# Altium integrated library TI Power Management Battery Management.IntLib: 950 symbols (part 9 of 48) (continued)
## BQ2012SN-D107TR (continued)

## BQ2012SND107TRG4
designator U?
NiCd / NiMH Gas Gauge with 1-Wire (DQ) Interface, 5 LED Drivers and Slow-Charge Control , 0 to 70 degC, 16-pin SOIC (D), Green (RoHS & no Sb/Br); PartNumber: BQ2012SND107TRG4; Manufacturer: Texas Instruments; Lead Acid: N; NiCd: Y; SubFamily: Battery Fuel Gauge; DatasheetVersion: Rev.A; PackageVersion: revM, Jun-2011; PackageReference: D16; PackageDescription: 16-Pin Plastic Small Outline Integrated Circuit, 9.9 x 3.9 mm, Pitch 1.27 mm Pitch; Supplier 1: Digi-Key; Supplier Part Number 1: BQ2012SND107TRG4-ND; Supplier Part Number 3: 595-BQ2012SND107TRG4; Eco-Plan: Green (RoHS & no Sb/Br); Li-Ion: N; Li-Polymer: N; NiMH: Y; Over Voltage Protection: N; Mounting Technology: Surface Mount; Code_JEDEC: MS-012AC; ComponentLink1Description: Datasheet; ComponentLink1URL: http://www.ti.com/general/docs/lit/getliterature.tsp?genericPartNumber=BQ2012&fileType=pdf
footprint D16_N (SOIC, 16-Leads, Body 9.9x3.9mm, Pitch 1.27mm, IPC Medium Density)
footprint D16_L (SOIC, 16-Leads, Body 9.9x3.9mm, Pitch 1.27mm, IPC High Density)
footprint D16_M (SOIC, 16-Leads, Body 9.9x3.9mm, Pitch 1.27mm, IPC Low Density)
pins: 1 LCOM (hiz) "Open-drain output switches VCC to source current for the LEDs. The switch is off during initialization to allow reading of the soft pull-up or pull-down program resistors. LCOM is also high impedance when the display is off.", 2 SEG1/PROG1 (io) "Each output may activate an LED to sink the current sourced from LCOM. / This three-level input pin defines the programmed full count (PFC) thresholds described in Table 2.", 3 SEG2/PROG2 (io) "Each output may activate an LED to sink the current sourced from LCOM. / This three-level input pin defines the programmed full count (PFC) thresholds described in Table 2.", 4 SEG3/PROG3 (io) "Each output may activate an LED to sink the current sourced from LCOM. / This three-level input pin defines the scale factor described in Table 2.", 5 SEG4/PROG4 (io) "Each output may activate an LED to sink the current sourced from LCOM. / This three-level input pin defines the scale factor described in Table 2.", 6 SEG5/PROG5 (io) "Each output may activate an LED to sink the current sourced from LCOM. / This three-level input pin defines the selfdischarge compensation rate shown in Table 1.", 7 SEG6/PROG6 (io) "Each output may activate an LED to sink the current sourced from LCOM. / This three-level pin defines the display operation shown in Table 1.", 8 VSS (power) "Ground", 9 SR (in) "The voltage drop (VSR) across the sense resistor RS is monitored and integrated over time to interpret charge and discharge activity. The SR input is tied to the high side of the sense resistor. VSR < VSS indicates (See Datasheet)", 10 ~{DISP} "D\I\S\P\ high disables the LED display. D\I\S\P\ tied to VCC allows PROGX to connect directly to VCC or VSS instead of through a pull-up or pull-down resistor. D\I\S\P\ floating allows the LED display to be active during (See Datasheet)", 11 SB (in) "This input monitors the single-cell voltage potential through a high-impedance resistive divider network for end-of-discharge voltage (EDV) thresholds, maximum charge voltage (MCV), and battery removed.", 12 EMPTY (hiz) "This open-drain output becomes high-impedance on detection of a valid end-of-discharge voltage (VEDVF) and is low following the next application of a valid charge.", 13 DQ (io) "This is an open-drain bidirectional pin.", 14 ~{CHG} (hiz) "This open-drain output becomes active low when charging is allowed. Valid charging conditions are described in the Charge Control section.", 15 REF (out) "REF provides a voltage reference output for an optional micro-regulator.", 16 VCC (power) "Supply voltage input."

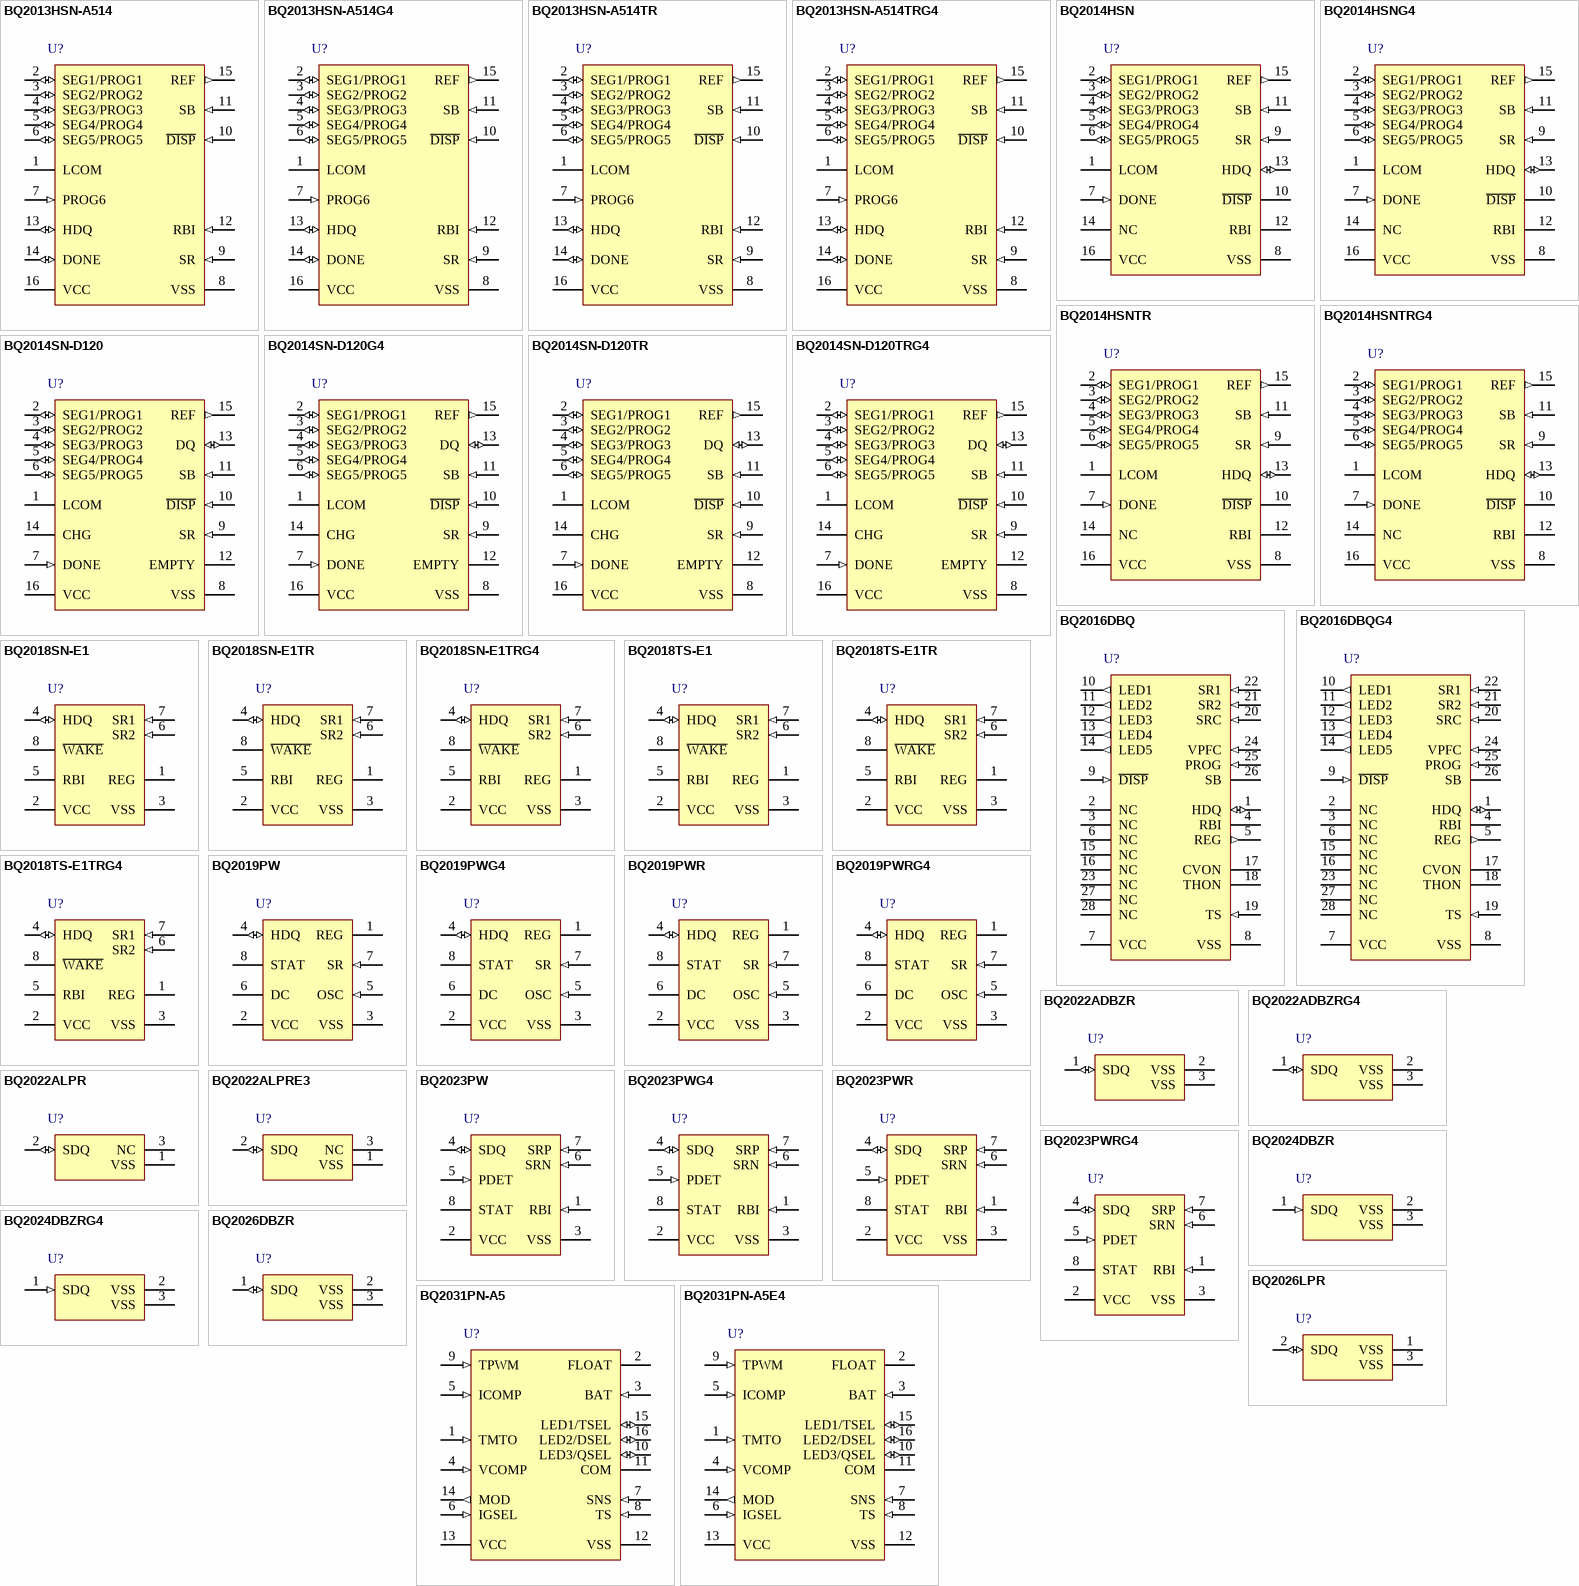
[diagram p6: symbols BQ2013HSN-A514 to BQ2031PN-A5E4]

## BQ2013HSN-A514
designator U?
NiCd / NiMH / Lead-Acid Gas Gauge for High Discharge Rates (>10 A), Pgmable Offset Error & Load Comp, 0 to 70 degC, 16-pin SOIC (D), Green (RoHS & no Sb/Br); PartNumber: BQ2013HSN-A514; Manufacturer: Texas Instruments; Lead Acid: Y; Li-Ion: N; SubFamily: Battery Fuel Gauge; DatasheetVersion: SLUS120; PackageVersion: revM, Jun-2011; PackageReference: D16; PackageDescription: 16-Pin Plastic Small Outline Integrated Circuit, 9.9 x 3.9 mm, Pitch 1.27 mm Pitch; Supplier 1: Digi-Key; Supplier Part Number 1: 296-9343-5-ND; Supplier Part Number 3: 595-BQ2013HSN-A514; Eco-Plan: Green (RoHS & no Sb/Br); Li-Polymer: N; NiCd: Y; NiMH: Y; Over Voltage Protection: N; Mounting Technology: Surface Mount; Code_JEDEC: MS-012AC; ComponentLink1Description: Datasheet; ComponentLink1URL: http://www.ti.com/general/docs/lit/getliterature.tsp?genericPartNumber=BQ2013H&fileType=pdf
footprint D16_N (SOIC, 16-Leads, Body 9.9x3.9mm, Pitch 1.27mm, IPC Medium Density)
footprint D16_L (SOIC, 16-Leads, Body 9.9x3.9mm, Pitch 1.27mm, IPC High Density)
footprint D16_M (SOIC, 16-Leads, Body 9.9x3.9mm, Pitch 1.27mm, IPC Low Density)
pins: 1 LCOM (hiz) "Open-drain output switches VCC to source current for the LEDs. The switch is off during initialization to allow reading of the soft pull-up or pull-down program resistors. LCOM is also high impedance when the display is off.", 2 SEG1/PROG1 (io) "Each output may activate an LED to sink the current sourced from LCOM. This three-level input pin defines the programmed full-count (PFC), display mode, self-discharge rate, offset compensation, overload threshold, and (See Datasheet)", 3 SEG2/PROG2 (io) "Each output may activate an LED to sink the current sourced from LCOM. This three-level input pin defines the programmed full-count (PFC), display mode, self-discharge rate, offset compensation, overload threshold, and (See Datasheet)", 4 SEG3/PROG3 (io) "Each output may activate an LED to sink the current sourced from LCOM. This three-level input pin defines the programmed full-count (PFC), display mode, self-discharge rate, offset compensation, overload threshold, and (See Datasheet)", 5 SEG4/PROG4 (io) "Each output may activate an LED to sink the current sourced from LCOM. This three-level input pin defines the programmed full-count (PFC), display mode, self-discharge rate, offset compensation, overload threshold, and (See Datasheet)", 6 SEG5/PROG5 (io) "Each output may activate an LED to sink the current sourced from LCOM. This three-level input pin defines the programmed full-count (PFC), display mode, self-discharge rate, offset compensation, overload threshold, and (See Datasheet)", 7 PROG6 (in) "This three-level input pin defines the programmed full-count (PFC), display mode, self-discharge rate, offset compensation, overload threshold, and charge compensation.", 8 VSS (power) "Ground", 9 SR (in) "The voltage drop (VSR) across the sense resistor RS is monitored and integrated over time to interpret charge and discharge activity. The SR input (see Figure 1) is connected between the negative terminal of the battery and (See Datasheet)", 10 ~{DISP} (in) "D\I\S\P\ pulled high disables the display. D\I\S\P\ floating allows the LED display to be active during certain charge and discharge conditions. Transitioning D\I\S\P\ low activates the display.", 11 SB (in) "This input monitors the scaled battery voltage through a high-impedance resistive divider network for the end-of-discharge voltage (EDV) thresholds.", 12 RBI (in) "This input is used to provide backup potential to the bq2013H registers during periods when VCC < 3V. A storage capacitor can be connected to RBI.", 13 HDQ (io) "This is an open-drain bidirectional communications port.", 14 DONE (io) "This input/output is used to communicate the status of an external charge controller to the bq2013H.", 15 REF (out) "REF provides a voltage reference output for an optional micro-regulator.", 16 VCC (power) "Supply voltage input"

## BQ2013HSN-A514G4
designator U?
NiCd / NiMH / Lead-Acid Gas Gauge for High Discharge Rates (>10 A), Pgmable Offset Error & Load Comp, 0 to 70 degC, 16-pin SOIC (D), Green (RoHS & no Sb/Br); PartNumber: BQ2013HSN-A514G4; Manufacturer: Texas Instruments; Lead Acid: Y; Li-Ion: N; SubFamily: Battery Fuel Gauge; DatasheetVersion: SLUS120; PackageVersion: revM, Jun-2011; PackageReference: D16; PackageDescription: 16-Pin Plastic Small Outline Integrated Circuit, 9.9 x 3.9 mm, Pitch 1.27 mm Pitch; Supplier 1: Digi-Key; Supplier Part Number 1: BQ2013HSN-A514G4-ND; Supplier Part Number 3: 62M9461; Eco-Plan: Green (RoHS & no Sb/Br); Li-Polymer: N; NiCd: Y; NiMH: Y; Over Voltage Protection: N; Mounting Technology: Surface Mount; Code_JEDEC: MS-012AC; ComponentLink1Description: Datasheet; ComponentLink1URL: http://www.ti.com/general/docs/lit/getliterature.tsp?genericPartNumber=BQ2013H&fileType=pdf
footprint D16_N (SOIC, 16-Leads, Body 9.9x3.9mm, Pitch 1.27mm, IPC Medium Density)
footprint D16_L (SOIC, 16-Leads, Body 9.9x3.9mm, Pitch 1.27mm, IPC High Density)
footprint D16_M (SOIC, 16-Leads, Body 9.9x3.9mm, Pitch 1.27mm, IPC Low Density)
pins: 1 LCOM (hiz) "Open-drain output switches VCC to source current for the LEDs. The switch is off during initialization to allow reading of the soft pull-up or pull-down program resistors. LCOM is also high impedance when the display is off.", 2 SEG1/PROG1 (io) "Each output may activate an LED to sink the current sourced from LCOM. This three-level input pin defines the programmed full-count (PFC), display mode, self-discharge rate, offset compensation, overload threshold, and (See Datasheet)", 3 SEG2/PROG2 (io) "Each output may activate an LED to sink the current sourced from LCOM. This three-level input pin defines the programmed full-count (PFC), display mode, self-discharge rate, offset compensation, overload threshold, and (See Datasheet)", 4 SEG3/PROG3 (io) "Each output may activate an LED to sink the current sourced from LCOM. This three-level input pin defines the programmed full-count (PFC), display mode, self-discharge rate, offset compensation, overload threshold, and (See Datasheet)", 5 SEG4/PROG4 (io) "Each output may activate an LED to sink the current sourced from LCOM. This three-level input pin defines the programmed full-count (PFC), display mode, self-discharge rate, offset compensation, overload threshold, and (See Datasheet)", 6 SEG5/PROG5 (io) "Each output may activate an LED to sink the current sourced from LCOM. This three-level input pin defines the programmed full-count (PFC), display mode, self-discharge rate, offset compensation, overload threshold, and (See Datasheet)", 7 PROG6 (in) "This three-level input pin defines the programmed full-count (PFC), display mode, self-discharge rate, offset compensation, overload threshold, and charge compensation.", 8 VSS (power) "Ground", 9 SR (in) "The voltage drop (VSR) across the sense resistor RS is monitored and integrated over time to interpret charge and discharge activity. The SR input (see Figure 1) is connected between the negative terminal of the battery and (See Datasheet)", 10 ~{DISP} (in) "D\I\S\P\ pulled high disables the display. D\I\S\P\ floating allows the LED display to be active during certain charge and discharge conditions. Transitioning D\I\S\P\ low activates the display.", 11 SB (in) "This input monitors the scaled battery voltage through a high-impedance resistive divider network for the end-of-discharge voltage (EDV) thresholds.", 12 RBI (in) "This input is used to provide backup potential to the bq2013H registers during periods when VCC < 3V. A storage capacitor can be connected to RBI.", 13 HDQ (io) "This is an open-drain bidirectional communications port.", 14 DONE (io) "This input/output is used to communicate the status of an external charge controller to the bq2013H.", 15 REF (out) "REF provides a voltage reference output for an optional micro-regulator.", 16 VCC (power) "Supply voltage input"

## BQ2013HSN-A514TR
designator U?
NiCd / NiMH / Lead-Acid Gas Gauge for High Discharge Rates (>10 A), Pgmable Offset Error & Load Comp, 0 to 70 degC, 16-pin SOIC (D), Green (RoHS & no Sb/Br); PartNumber: BQ2013HSN-A514TR; Manufacturer: Texas Instruments; Lead Acid: Y; Li-Ion: N; SubFamily: Battery Fuel Gauge; DatasheetVersion: SLUS120; PackageVersion: revM, Jun-2011; PackageReference: D16; PackageDescription: 16-Pin Plastic Small Outline Integrated Circuit, 9.9 x 3.9 mm, Pitch 1.27 mm Pitch; Supplier 1: Digi-Key; Supplier Part Number 1: BQ2013HSN-A514TR-ND; Supplier Part Number 3: 595-BQ2013HSN-A514TR; Eco-Plan: Green (RoHS & no Sb/Br); Li-Polymer: N; NiCd: Y; NiMH: Y; Over Voltage Protection: N; Mounting Technology: Surface Mount; Code_JEDEC: MS-012AC; ComponentLink1Description: Datasheet; ComponentLink1URL: http://www.ti.com/general/docs/lit/getliterature.tsp?genericPartNumber=BQ2013H&fileType=pdf
footprint D16_N (SOIC, 16-Leads, Body 9.9x3.9mm, Pitch 1.27mm, IPC Medium Density)
footprint D16_L (SOIC, 16-Leads, Body 9.9x3.9mm, Pitch 1.27mm, IPC High Density)
footprint D16_M (SOIC, 16-Leads, Body 9.9x3.9mm, Pitch 1.27mm, IPC Low Density)
pins: 1 LCOM (hiz) "Open-drain output switches VCC to source current for the LEDs. The switch is off during initialization to allow reading of the soft pull-up or pull-down program resistors. LCOM is also high impedance when the display is off.", 2 SEG1/PROG1 (io) "Each output may activate an LED to sink the current sourced from LCOM. This three-level input pin defines the programmed full-count (PFC), display mode, self-discharge rate, offset compensation, overload threshold, and (See Datasheet)", 3 SEG2/PROG2 (io) "Each output may activate an LED to sink the current sourced from LCOM. This three-level input pin defines the programmed full-count (PFC), display mode, self-discharge rate, offset compensation, overload threshold, and (See Datasheet)", 4 SEG3/PROG3 (io) "Each output may activate an LED to sink the current sourced from LCOM. This three-level input pin defines the programmed full-count (PFC), display mode, self-discharge rate, offset compensation, overload threshold, and (See Datasheet)", 5 SEG4/PROG4 (io) "Each output may activate an LED to sink the current sourced from LCOM. This three-level input pin defines the programmed full-count (PFC), display mode, self-discharge rate, offset compensation, overload threshold, and (See Datasheet)", 6 SEG5/PROG5 (io) "Each output may activate an LED to sink the current sourced from LCOM. This three-level input pin defines the programmed full-count (PFC), display mode, self-discharge rate, offset compensation, overload threshold, and (See Datasheet)", 7 PROG6 (in) "This three-level input pin defines the programmed full-count (PFC), display mode, self-discharge rate, offset compensation, overload threshold, and charge compensation.", 8 VSS (power) "Ground", 9 SR (in) "The voltage drop (VSR) across the sense resistor RS is monitored and integrated over time to interpret charge and discharge activity. The SR input (see Figure 1) is connected between the negative terminal of the battery and (See Datasheet)", 10 ~{DISP} (in) "D\I\S\P\ pulled high disables the display. D\I\S\P\ floating allows the LED display to be active during certain charge and discharge conditions. Transitioning D\I\S\P\ low activates the display.", 11 SB (in) "This input monitors the scaled battery voltage through a high-impedance resistive divider network for the end-of-discharge voltage (EDV) thresholds.", 12 RBI (in) "This input is used to provide backup potential to the bq2013H registers during periods when VCC < 3V. A storage capacitor can be connected to RBI.", 13 HDQ (io) "This is an open-drain bidirectional communications port.", 14 DONE (io) "This input/output is used to communicate the status of an external charge controller to the bq2013H.", 15 REF (out) "REF provides a voltage reference output for an optional micro-regulator.", 16 VCC (power) "Supply voltage input"

## BQ2013HSN-A514TRG4
designator U?
NiCd / NiMH / Lead-Acid Gas Gauge for High Discharge Rates (>10 A), Pgmable Offset Error & Load Comp, 0 to 70 degC, 16-pin SOIC (D), Green (RoHS & no Sb/Br); PartNumber: BQ2013HSN-A514TRG4; Manufacturer: Texas Instruments; Lead Acid: Y; Li-Ion: N; SubFamily: Battery Fuel Gauge; DatasheetVersion: SLUS120; PackageVersion: revM, Jun-2011; PackageReference: D16; PackageDescription: 16-Pin Plastic Small Outline Integrated Circuit, 9.9 x 3.9 mm, Pitch 1.27 mm Pitch; Supplier 1: Digi-Key; Supplier Part Number 1: BQ2013HSN-A514TRG4-ND; Supplier Part Number 3: 595-BQ2013HSA514TRG4; Eco-Plan: Green (RoHS & no Sb/Br); Li-Polymer: N; NiCd: Y; NiMH: Y; Over Voltage Protection: N; Mounting Technology: Surface Mount; Code_JEDEC: MS-012AC; ComponentLink1Description: Datasheet; ComponentLink1URL: http://www.ti.com/general/docs/lit/getliterature.tsp?genericPartNumber=BQ2013H&fileType=pdf
footprint D16_N (SOIC, 16-Leads, Body 9.9x3.9mm, Pitch 1.27mm, IPC Medium Density)
footprint D16_L (SOIC, 16-Leads, Body 9.9x3.9mm, Pitch 1.27mm, IPC High Density)
footprint D16_M (SOIC, 16-Leads, Body 9.9x3.9mm, Pitch 1.27mm, IPC Low Density)
pins: 1 LCOM (hiz) "Open-drain output switches VCC to source current for the LEDs. The switch is off during initialization to allow reading of the soft pull-up or pull-down program resistors. LCOM is also high impedance when the display is off.", 2 SEG1/PROG1 (io) "Each output may activate an LED to sink the current sourced from LCOM. This three-level input pin defines the programmed full-count (PFC), display mode, self-discharge rate, offset compensation, overload threshold, and (See Datasheet)", 3 SEG2/PROG2 (io) "Each output may activate an LED to sink the current sourced from LCOM. This three-level input pin defines the programmed full-count (PFC), display mode, self-discharge rate, offset compensation, overload threshold, and (See Datasheet)", 4 SEG3/PROG3 (io) "Each output may activate an LED to sink the current sourced from LCOM. This three-level input pin defines the programmed full-count (PFC), display mode, self-discharge rate, offset compensation, overload threshold, and (See Datasheet)", 5 SEG4/PROG4 (io) "Each output may activate an LED to sink the current sourced from LCOM. This three-level input pin defines the programmed full-count (PFC), display mode, self-discharge rate, offset compensation, overload threshold, and (See Datasheet)", 6 SEG5/PROG5 (io) "Each output may activate an LED to sink the current sourced from LCOM. This three-level input pin defines the programmed full-count (PFC), display mode, self-discharge rate, offset compensation, overload threshold, and (See Datasheet)", 7 PROG6 (in) "This three-level input pin defines the programmed full-count (PFC), display mode, self-discharge rate, offset compensation, overload threshold, and charge compensation.", 8 VSS (power) "Ground", 9 SR (in) "The voltage drop (VSR) across the sense resistor RS is monitored and integrated over time to interpret charge and discharge activity. The SR input (see Figure 1) is connected between the negative terminal of the battery and (See Datasheet)", 10 ~{DISP} (in) "D\I\S\P\ pulled high disables the display. D\I\S\P\ floating allows the LED display to be active during certain charge and discharge conditions. Transitioning D\I\S\P\ low activates the display.", 11 SB (in) "This input monitors the scaled battery voltage through a high-impedance resistive divider network for the end-of-discharge voltage (EDV) thresholds.", 12 RBI (in) "This input is used to provide backup potential to the bq2013H registers during periods when VCC < 3V. A storage capacitor can be connected to RBI.", 13 HDQ (io) "This is an open-drain bidirectional communications port.", 14 DONE (io) "This input/output is used to communicate the status of an external charge controller to the bq2013H.", 15 REF (out) "REF provides a voltage reference output for an optional micro-regulator.", 16 VCC (power) "Supply voltage input"

## BQ2014HSN
designator U?
NiCd / NiMH Gas Gauge with High-Speed 1-Wire (HDQ) Interface and 5 LED Drivers, 16-pin SOIC (D), Green (RoHS & no Sb/Br); PartNumber: BQ2014HSN; Manufacturer: Texas Instruments; Lead Acid: N; NiCd: Y; SubFamily: Battery Fuel Gauge; DatasheetVersion: SLUS030A; PackageVersion: revM, Jun-2011; PackageReference: D16; PackageDescription: 16-Pin Plastic Small Outline Integrated Circuit, 9.9 x 3.9 mm, Pitch 1.27 mm Pitch; Supplier 1: Digi-Key; Supplier Part Number 1: 296-9345-5-ND; Supplier Part Number 3: 74C7556; Eco-Plan: Green (RoHS & no Sb/Br); Li-Ion: N; Li-Polymer: N; NiMH: Y; Over Voltage Protection: N; Mounting Technology: Surface Mount; Code_JEDEC: MS-012AC; ComponentLink1Description: Datasheet; ComponentLink1URL: http://www.ti.com/general/docs/lit/getliterature.tsp?genericPartNumber=BQ2014H&fileType=pdf
footprint D16_N (SOIC, 16-Leads, Body 9.9x3.9mm, Pitch 1.27mm, IPC Medium Density)
footprint D16_L (SOIC, 16-Leads, Body 9.9x3.9mm, Pitch 1.27mm, IPC High Density)
footprint D16_M (SOIC, 16-Leads, Body 9.9x3.9mm, Pitch 1.27mm, IPC Low Density)
pins: 1 LCOM (hiz) "LED common output.Open-drain output that switches VCC to source current for the LEDs. The switch is off during initialization to allow reading of the soft pull-up or pull-down program resistors.LCOM is also high impedance (See Datasheet)", 2 SEG1/PROG1 (io) "LED display segment outputs (dual function with PROG1).Outputs that each may activate an LED to sink the current sourced from LCOM.Programmed full count selection inputs(dual function with SEG1).Three-level input pins that (See Datasheet)", 3 SEG2/PROG2 (io) "LED display segment outputs (dual function with PROG2).Outputs that each may activate an LED to sink the current sourced from LCOM.Programmed full count selection inputs(dual function with SEG2).Three-level input pins that (See Datasheet)", 4 SEG3/PROG3 (io) "LED display segment outputs (dual function with PROG3).Outputs that each may activate an LED to sink the current sourced from LCOM.Power gauge scale selection inputs (dual function with SEG3).Three-level input pins that (See Datasheet)", 5 SEG4/PROG4 (io) "LED display segment outputs (dual function with PROG4).Outputs that each may activate an LED to sink the current sourced from LCOM.Power gauge scale selection inputs (dual function with SEG4).Three-level input pins that (See Datasheet)", 6 SEG5/PROG5 (io) "LED display segment outputs (dual function with PROG5).Outputs that each may activate an LED to sink the current sourced from LCOM.Self-discharge rate selection (dual function with SEG5).Three-level input pin that defines (See Datasheet)", 7 DONE (in) "Charge complete input.Communicates the status of an external charge-controller such as the bq2004 Fast-Charge IC to the bq2014H. Note: This pin must be pulled down to VSS using a 200kohm  resistor.", 8 VSS (power) "Ground", 9 SR (in) "The voltage drop (VSR) across the sense resistor RS is monitored and integrated over ime to interpret charge and discharge activity.VSR < VSS indicates discharge, and VSR >VSS indicates charge. The effective voltage drop, (See Datasheet)", 10 ~{DISP} "Display control input.D\I\S\P\ high disables the LED display. D\I\S\P\ tied to VCC allows PROGX to connect directly to VCC or VSS instead of through a pull-up or pull-down resistor. D\I\S\P\ floating allows the LED display (See Datasheet)", 11 SB (in) "Secondary battery input.Monitors the battery cell-voltage potential through a high-impedance resistive divider network for end-of-discharge voltage (EDV) thresholds and for battery-removed detection.", 12 RBI (power) "Register backup input.Provides backup potential to the bq2014H registers while VCC =< 3V. A storage capacitor or a battery can be connected to RBI.", 13 HDQ (io) "Serial communications input/output.This is the open-drain bidirectional communications port.", 14 NC "No connect", 15 REF (out) "Voltage reference output.REF provides a voltage reference output for an optional microregulator.", 16 VCC (power) "Supply voltage input"

## BQ2014HSNG4
designator U?
NiCd / NiMH Gas Gauge with High-Speed 1-Wire (HDQ) Interface and 5 LED Drivers, 16-pin SOIC (D), Green (RoHS & no Sb/Br); PartNumber: BQ2014HSNG4; Manufacturer: Texas Instruments; Lead Acid: N; NiCd: Y; SubFamily: Battery Fuel Gauge; DatasheetVersion: SLUS030A; PackageVersion: revM, Jun-2011; PackageReference: D16; PackageDescription: 16-Pin Plastic Small Outline Integrated Circuit, 9.9 x 3.9 mm, Pitch 1.27 mm Pitch; Supplier 1: Digi-Key; Supplier Part Number 1: BQ2014HSNG4-ND; Supplier Part Number 3: 595-BQ2014HSNG4; Eco-Plan: Green (RoHS & no Sb/Br); Li-Ion: N; Li-Polymer: N; NiMH: Y; Over Voltage Protection: N; Mounting Technology: Surface Mount; Code_JEDEC: MS-012AC; ComponentLink1Description: Datasheet; ComponentLink1URL: http://www.ti.com/general/docs/lit/getliterature.tsp?genericPartNumber=BQ2014H&fileType=pdf
footprint D16_N (SOIC, 16-Leads, Body 9.9x3.9mm, Pitch 1.27mm, IPC Medium Density)
footprint D16_L (SOIC, 16-Leads, Body 9.9x3.9mm, Pitch 1.27mm, IPC High Density)
footprint D16_M (SOIC, 16-Leads, Body 9.9x3.9mm, Pitch 1.27mm, IPC Low Density)
pins: 1 LCOM (hiz) "LED common output.Open-drain output that switches VCC to source current for the LEDs. The switch is off during initialization to allow reading of the soft pull-up or pull-down program resistors.LCOM is also high impedance (See Datasheet)", 2 SEG1/PROG1 (io) "LED display segment outputs (dual function with PROG1).Outputs that each may activate an LED to sink the current sourced from LCOM.Programmed full count selection inputs(dual function with SEG1).Three-level input pins that (See Datasheet)", 3 SEG2/PROG2 (io) "LED display segment outputs (dual function with PROG2).Outputs that each may activate an LED to sink the current sourced from LCOM.Programmed full count selection inputs(dual function with SEG2).Three-level input pins that (See Datasheet)", 4 SEG3/PROG3 (io) "LED display segment outputs (dual function with PROG3).Outputs that each may activate an LED to sink the current sourced from LCOM.Power gauge scale selection inputs (dual function with SEG3).Three-level input pins that (See Datasheet)", 5 SEG4/PROG4 (io) "LED display segment outputs (dual function with PROG4).Outputs that each may activate an LED to sink the current sourced from LCOM.Power gauge scale selection inputs (dual function with SEG4).Three-level input pins that (See Datasheet)", 6 SEG5/PROG5 (io) "LED display segment outputs (dual function with PROG5).Outputs that each may activate an LED to sink the current sourced from LCOM.Self-discharge rate selection (dual function with SEG5).Three-level input pin that defines (See Datasheet)", 7 DONE (in) "Charge complete input.Communicates the status of an external charge-controller such as the bq2004 Fast-Charge IC to the bq2014H. Note: This pin must be pulled down to VSS using a 200kohm  resistor.", 8 VSS (power) "Ground", 9 SR (in) "The voltage drop (VSR) across the sense resistor RS is monitored and integrated over ime to interpret charge and discharge activity.VSR < VSS indicates discharge, and VSR >VSS indicates charge. The effective voltage drop, (See Datasheet)", 10 ~{DISP} "Display control input.D\I\S\P\ high disables the LED display. D\I\S\P\ tied to VCC allows PROGX to connect directly to VCC or VSS instead of through a pull-up or pull-down resistor. D\I\S\P\ floating allows the LED display (See Datasheet)", 11 SB (in) "Secondary battery input.Monitors the battery cell-voltage potential through a high-impedance resistive divider network for end-of-discharge voltage (EDV) thresholds and for battery-removed detection.", 12 RBI (power) "Register backup input.Provides backup potential to the bq2014H registers while VCC =< 3V. A storage capacitor or a battery can be connected to RBI.", 13 HDQ (io) "Serial communications input/output.This is the open-drain bidirectional communications port.", 14 NC "No connect", 15 REF (out) "Voltage reference output.REF provides a voltage reference output for an optional microregulator.", 16 VCC (power) "Supply voltage input"